# Altium footprint library Cyberdeck.PcbLib: 261 footprints (part 7 of 17)
Each footprint in its own frame and in the unit in brackets; x right, y up, seen from the top. Pads: shape width x height; smd on the part's side, far side on the other; paste and mask are expansions set on the pad; w line width, h text height; cw(c..) or ccw(c..) is an arc to the next point about the centre after c.
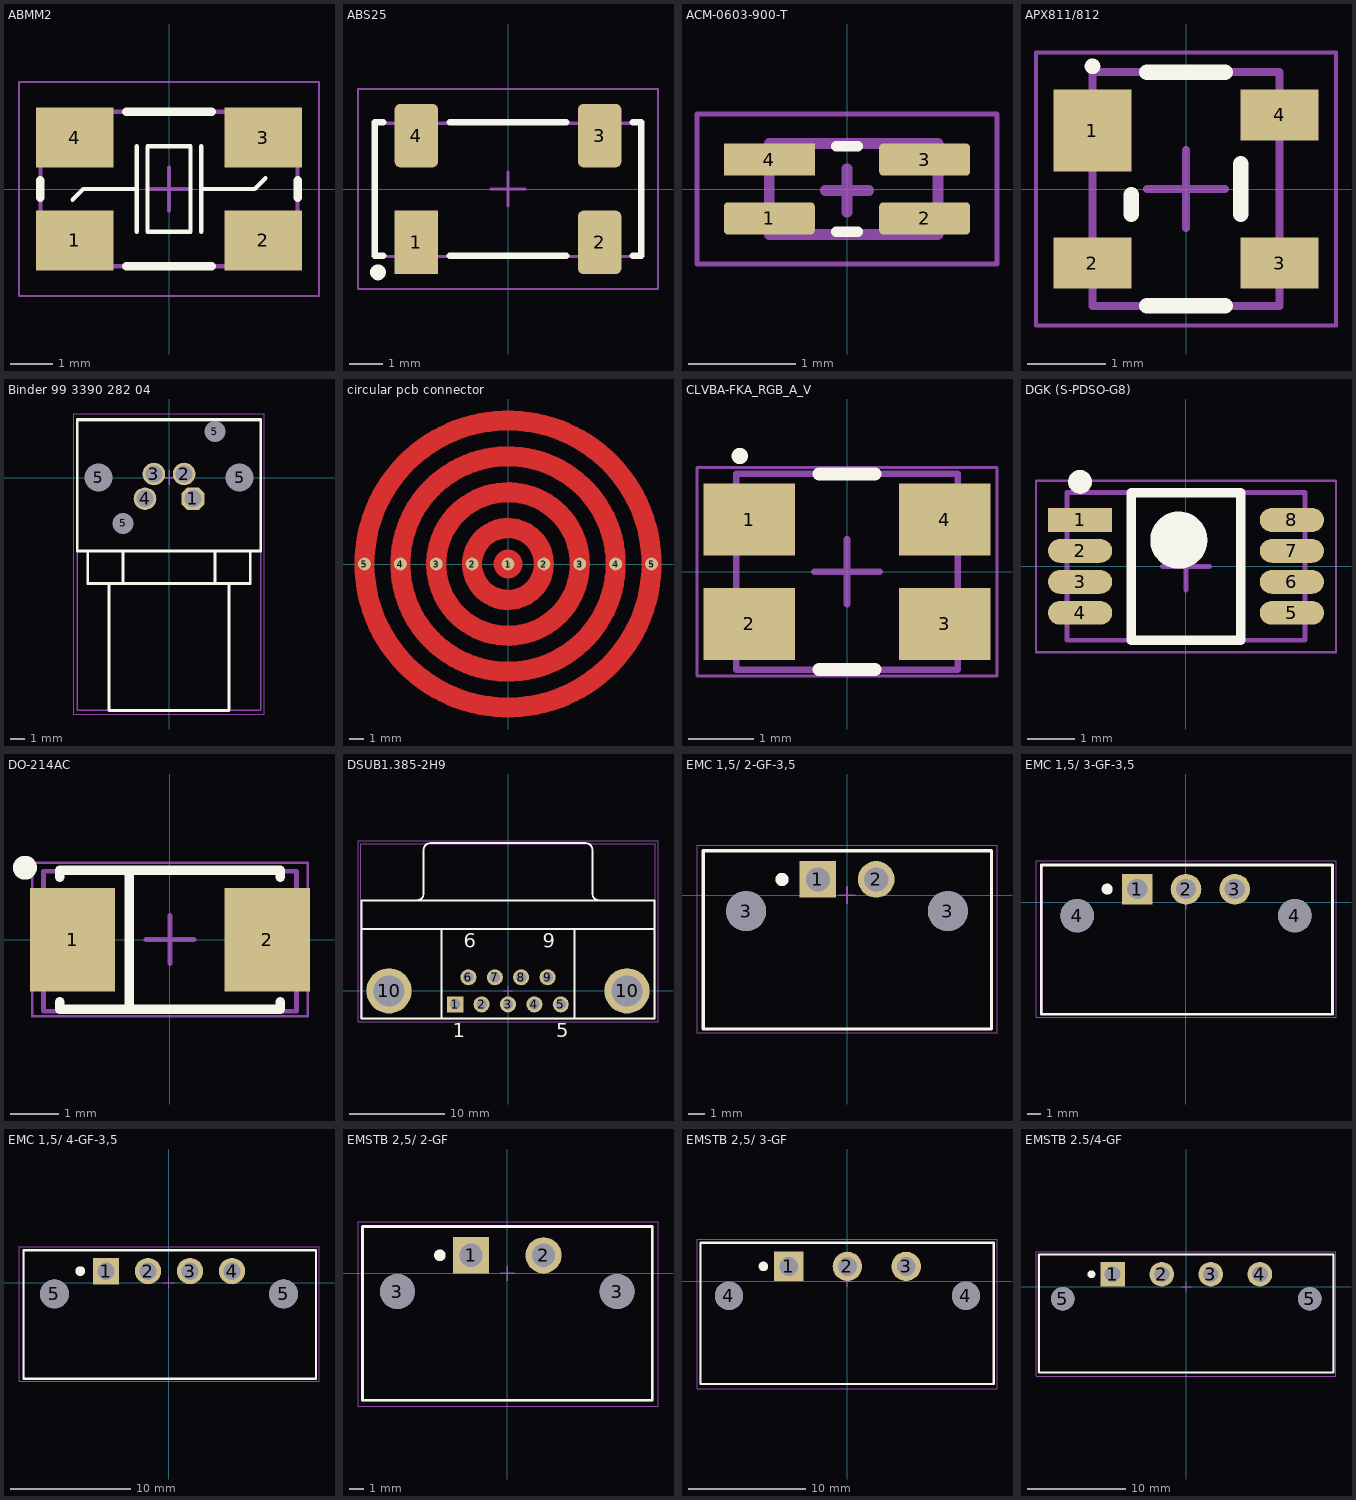
[diagram p6: the footprints below, top view; thin cyan lines are the x and y axes]

## ABMM2 [mm] "ABMM2"
height 1.2
pads (4):
  rect 1.8x1.4 smd: 1(-2.2,-1.2) 2(2.2,-1.2) 3(2.2,1.2) 4(-2.2,1.2)
Top Overlay:
  lines w0.1: -2.25,-0.25 -2,0 -0.75,0 ; -0.75,-1 -0.75,1 ; 0.75,-1 0.75,1 ; 0.75,0 2,0 2.25,0.25 ; -0.5,-1 0.5,-1 0.5,1 -0.5,1 -0.5,0.5 -0.5,-0.5 -0.5,-1
  lines w0.2: -3,-0.2 -3,0.2 ; -1,-1.8 1,-1.8 ; -1,1.8 1,1.8 ; 3,-0.2 3,0.2
Assembly Top:
  lines w0.1: -3,-1.8 -3,1.8 3,1.8 3,-1.8 -3,-1.8 ; -3,-1.8 -3,-1.8
Courtyard Top:
  lines w0.05: -3.5,-2.5 -3.5,2.5 3.5,2.5 3.5,-2.5 -3.5,-2.5
  lines w0.1: -0.5,0 0.5,0 ; 0,-0.5 0,0.5
3D body "ABMM2.STEP": height 1.21, standoff 0.01, extent -3,-1.8 3,1.8

## ABS25 [mm] "ABS25"
height 2.5
pads (4):
  rect 1.3x1.9 smd: 1(-2.75,-1.6)
  rrect25% 1.3x1.9 smd: 2(2.75,-1.6) 3(2.75,1.6) 4(-2.75,1.6)
Top Overlay:
  circle w0.254: c-3.9,-2.5 r0.112
  lines w0.2: -3.75,-2 -4,-2 -4,2 -3.75,2 ; -1.75,-2 1.75,-2 ; -1.75,2 1.75,2 ; 3.75,-2 4,-2 4,2 3.75,2
Assembly Top:
  lines w0.1: -4.025,-2.025 3.975,-2.025 3.975,1.975 -4.025,1.975 -4.025,-2.025
Courtyard Top:
  lines w0.05: -4.5,-3 4.5,-3 4.5,3 -4.5,3 -4.5,-3
  lines w0.1: -0.5,0 0.5,0 ; 0,-0.5 0,0.5
3D body "ABS25.STEP": height 2.51, standoff -0.15, extent -4.025,-2.025 3.975,1.975

## ACM-0603-900-T [mm] "ACM-0603-900-T"
height 1.1
pads (4):
  rrect25% 0.85x0.3 smd: 1(-0.725,-0.275) 2(0.725,-0.275) 3(0.725,0.275)
  rect 0.85x0.3 smd: 4(-0.725,0.275)
Top Overlay:
  lines w0.1: -0.1,-0.4 0.1,-0.4 ; -0.1,0.4 0.1,0.4
Assembly Top:
  lines w0.1: -0.725,-0.425 0.85,-0.425 0.85,0.425 -0.725,0.425 -0.725,-0.425
Courtyard Top:
  lines w0.05: -1.4,-0.7 1.4,-0.7 1.4,0.7 -1.4,0.7 -1.4,-0.7
  lines w0.1: -0.203,-0.015 0.203,-0.015 ; 0,-0.218 0,0.188
3D body "ACM-0603.STEP": height 1.11, standoff -0.02, extent -0.738,-0.425 0.862,0.425

## APX811/812 [mm] "SOT143, 4-Leads, Body 2.90x2.37mm, Pitch 1.90mm, IPC Medium Density"
height 1
pads (4):
  rect 1x1.05 smd: 1(-1.2,0.75)
  rect 1x0.65 smd: 2(-1.2,-0.95) 3(1.2,-0.95) 4(1.2,0.95)
Top Overlay:
  circle w0.1: c-1.2,1.575 r0.05
  lines w0.2: -0.7,-0.325 -0.7,-0.075 ; -0.5,-1.5 0.5,-1.5 ; -0.5,1.5 0.5,1.5 ; 0.7,-0.325 0.7,0.325
Assembly Top:
  lines w0.1: -1.2,-1.5 -1.2,1.5 1.2,1.5 1.2,-1.5 -1.2,-1.5
Courtyard Top:
  lines w0.05: -1.925,-1.75 -1.925,1.75 1.925,1.75 1.925,-1.75 -1.925,-1.75
  lines w0.1: -0.5,0 0.5,0 ; 0,-0.5 0,0.5
3D body "User Library-SOT143-1.STEP": height 1.22, standoff 0, extent -1.182,-1.45 1.181,1.45

## Binder 99 3390 282 04 [mm] "Binder 99 3390 282 04"
height 12
pads (8):
  oct 1.6x1.6 hole 1.2: 1(1.7,-1.5)
  round 1.6 hole 1.2: 2(1.07,0.25) 3(-1.07,0.25) 4(-1.7,-1.5)
  round 1.5 hole 2 unplated: 5(-5,0) 5(5,0)
  round 1 hole 1.5 unplated: 5(-3.25,-3.25) 5(3.25,3.25)
Top Overlay:
  lines w0.2: -5.75,-5.2 -5.75,-7.5 5.75,-7.5 5.75,-5.2 ; -4.25,-7.5 -4.25,-16.5 4.25,-16.5 4.25,-7.5 ; -3.25,-7.5 -3.25,-5.25 ; 3.25,-7.5 3.25,-5.25 ; -6.5,-5.2 -6.5,4.1 6.5,4.1 6.5,-5.2 -6.5,-5.2
Assembly Top:
  lines w0.1: -6.499,-16.5 6.5,-16.5 6.5,4 -6.499,4 -6.499,-16.5
Courtyard Top:
  lines w0.05: -6.75,-16.75 -6.75,4.5 6.75,4.5 6.75,-16.75 -6.75,-16.75
  lines w0.1: -0.5,0 0.5,0 ; 0,-0.5 0,0.5
3D body "99_3390_282_04.stp": height 12.01, standoff -4.49, extent -6.499,-16.5 6.5,4

## circular pcb connector [mm]
pads (9):
  round 0.9 hole 0.3: 1(0,0) 2(-2.5,0) 2(2.5,0) 3(-5,0) 3(5,0) 4(-7.5,0) 4(7.5,0) 5(-10,0) 5(10,0)
Top Layer:
  circle w1: c0,0 r0.5
  circle w1.4: c0,0 r2.5
  circle w1.4: c0,0 r5
  circle w1.4: c0,0 r7.5
  circle w1.4: c0,0 r10
Bottom Layer:
  lines w1: -10,0 cw(c0,0) 10,0 ; -7.5,0 cw(c0,0) 7.5,0 ; -5,0 cw(c0,0) 5,0 ; -2.5,0 cw(c0,0) 2.5,0
Top Solder:
  circle w1.7: c0,0 r10
  circle w1.7: c0,0 r7.5
  circle w1.7: c0,0 r5
  circle w1.7: c0,0 r2.5
  circle w1.3: c0,0 r0.5

## CLVBA-FKA_RGB_A_V [mm] "SMD, 4-Leads, Body 3.2x2.8mm"
height 2.1
pads (4):
  rect 1.4x1.1 smd: 1(-1.5,0.8) 2(-1.5,-0.8) 3(1.5,-0.8) 4(1.5,0.8)
Top Overlay:
  circle w0.125: c-1.644,1.775 r0.062
  lines w0.2: -0.429,-1.5 0.429,-1.5 ; -0.429,1.5 0.429,1.5
Assembly Top:
  lines w0.1: -1.7,-1.5 1.7,-1.5 1.7,1.5 -1.7,1.5 -1.7,-1.5
Courtyard Top:
  lines w0.05: -2.3,-1.6 2.3,-1.6 2.3,1.6 -2.3,1.6 -2.3,-1.6
  lines w0.1: -0.5,0 0.5,0 ; 0,-0.5 0,0.5
3D body: height 2, standoff 1.6, extent -1,-1 1,-0.4
3D body: height 2, standoff 1.6, extent -1,-0.4 1,0.4
3D body: height 1.6, standoff 0.9, extent -1.7,-1.5 1.7,1.5
3D body: height 2.1, standoff 1.6, extent 0,-1.5 1.7,1.5
3D body: height 2.1, standoff 1.6, extent -1.7,-1.5 0,1.5
3D body: height 2, standoff 1.6, extent -1,0.4 1,1
3D body: height 1.1, standoff 0, extent -1.85,-1.1 1.85,-0.4
3D body: height 1.1, standoff 0, extent -1.85,0.4 1.85,1.1
3D body: height 0.9, standoff 0, extent -1.7,-1.5 1.7,1.5

## DGK (S-PDSO-G8) [mm] "TSOP, 8-Leads, Body 3.00x3.00mm, Pitch 0.65mm, IPC Medium Density"
height 1.1
pads (8):
  rect 1.35x0.5 smd: 1(-2.225,0.975)
  oval 1.35x0.5 smd: 2(-2.225,0.325) 3(-2.225,-0.325) 4(-2.225,-0.975) 5(2.225,-0.975) 6(2.225,-0.325) 7(2.225,0.325) 8(2.225,0.975)
Top Overlay:
  circle w0.6: c-0.15,0.55 r0.3
  circle w0.25: c-2.225,1.775 r0.125
  lines w0.2: -1.15,-1.55 1.15,-1.55 1.15,1.55 -1.15,1.55 -1.15,-1.55
Assembly Top:
  lines w0.1: -2.5,-1.55 2.5,-1.55 2.5,1.55 -2.5,1.55 -2.5,-1.55
Courtyard Top:
  lines w0.05: -3.15,-1.8 3.15,-1.8 3.15,1.8 -3.15,1.8 -3.15,-1.8
  lines w0.1: -0.5,0 0.5,0 ; 0,-0.5 0,0.5
3D body "DGK (S-PDSO-G8).step": height 1.1, standoff 0, extent -2.45,-1.55 2.45,1.55

## DO-214AC [mil] "DO-214AC"
height 96.06
pads (2):
  rect 70x85 smd: 1(-80,0) 2(80,0)
Top Overlay:
  circle w9.84: c-119.09,59.06 r4.92
  lines w7.87: -90.55,-51.18 -90.55,-57.09 90.55,-57.09 90.55,-51.18 ; -90.55,51.18 -90.55,57.09 90.55,57.09 90.55,51.18 ; -33.46,-56.1 -33.46,57.09
Assembly Top:
  lines w3.94: -103.95,-58.86 103.94,-58.86 103.94,56.1 -103.95,56.1 -103.95,-58.86
Courtyard Top:
  lines w1.97: -113.19,-62.99 113.19,-62.99 113.19,62.99 -113.19,62.99 -113.19,-62.99
  lines w3.94: -19.69,0 19.68,0 ; 0,-19.68 0,19.68
3D body "Diode SMA.stp": height 94.95, standoff 0, extent -103.94,-58.86 103.93,56.1

## DSUB1.385-2H9 [mm] "Connector; D Subminiature; 9 Position; Right Angle; Pitch 1.385 mm"
height 12.75
pads (11):
  rect 1.69x1.69 hole 1.09: 1(-5.54,-1.42)
  round 1.69 hole 1.09: 2(-2.77,-1.42) 3(0,-1.42) 4(2.77,-1.42) 5(5.54,-1.42) 6(-4.155,1.42) 7(-1.385,1.42) 8(1.385,1.42) 9(4.155,1.42)
  round 4.76 hole 3.26: 10(-12.495,0) 10(12.495,0)
Top Overlay:
  lines w0.2: -15.4,6.5 15.4,6.5 ; -9.56,9.505 ccw(c-9.56,10.2) -8.865,10.2 -8.865,14.8 ; -8.86,14.805 cw(c-8.165,14.805) -8.165,15.5 8.165,15.5 cw(c8.165,14.805) 8.86,14.805 ; -7,-2.9 -7,6.5 ; 7,-2.9 7,6.5 ; 8.865,14.8 8.865,10.2 ccw(c9.56,10.2) 9.56,9.505 ; -15.4,-2.9 15.4,-2.9 15.4,9.5 -15.4,9.5 -15.4,-2.9
  text "6" at -4.655,4.525 h1.5
  text "9" at 3.655,4.525 h1.5
  text "5" at 5.04,-4.875 h1.5
  text "1" at -5.79,-4.875 h1.5
Assembly Top:
  lines w0.1: -15.45,-2.95 -15.45,15.45 15.45,15.45 15.45,-2.95 ; -15.45,-2.95 -15.45,-2.95 ; -15.45,-2.95 15.45,-2.95 ; 15.45,-2.95 15.45,-2.95
Courtyard Top:
  lines w0.05: -15.75,-3.25 -15.75,15.75 15.75,15.75 15.75,-3.25 -15.75,-3.25
  lines w0.1: -0.5,0 0.5,0 ; 0,-0.5 0,0.5
3D body "DB9.STEP": height 12.51, standoff -3.99, extent -15.45,-2.95 15.45,15.45

## EMC 1,5/ 2-GF-3,5 [mm] "EMC 1,5/ 2-GF-3,5"
height 7
pads (4):
  rect 2.2x2.2 hole 1.45: 1(-1.75,0.95)
  round 2.2 hole 1.45: 2(1.75,0.95)
  round 2.4 hole 2.4 unplated: 3(-6.05,-0.95) 3(6.05,-0.95)
Top Overlay:
  circle w0.5: c-3.9,0.95 r0.15
  lines w0.2: -8.625,-8.025 -8.625,2.675 8.675,2.675 8.675,-8.025 -8.625,-8.025
Assembly Top:
  lines w0.1: -8.625,-8.025 8.675,-8.025 8.675,2.675 -8.625,2.675 -8.625,-8.025
Courtyard Top:
  lines w0.05: -9,-8.25 9,-8.25 9,3 -9,3 -9,-8.25
  lines w0.1: -0.5,0 0.5,0 ; 0,-0.5 0,0.5
3D body "1897241_05.stp": height 7.01, standoff -3.49, extent -8.625,-8.025 8.675,2.675

## EMC 1,5/ 3-GF-3,5 [mm] "EMC 1,5/ 3-GF-3,5"
height 7
pads (5):
  rect 2.2x2.2 hole 1.45: 1(-3.5,0.95)
  round 2.2 hole 1.45: 2(0,0.95) 3(3.5,0.95)
  round 2.4 hole 2.4 unplated: 4(-7.8,-0.95) 4(7.8,-0.95)
Top Overlay:
  circle w0.5: c-5.65,0.95 r0.15
  lines w0.2: -10.375,-8.025 10.5,-8.025 10.5,2.675 -10.375,2.675 -10.375,-8.025
Assembly Top:
  lines w0.1: -10.3,-8 -10.3,2.7 10.5,2.7 10.5,-8 -10.3,-8
Courtyard Top:
  lines w0.05: -10.75,-8.25 -10.75,3 10.75,3 10.75,-8.25 -10.75,-8.25
  lines w0.1: -0.5,0 0.5,0 ; 0,-0.5 0,0.5
3D body "1897254_05.stp": height 7.01, standoff -3.49, extent -10.3,-8 10.5,2.7

## EMC 1,5/ 4-GF-3,5 [mm] "EMC 1,5/ 4-GF-3,5"
height 7
pads (6):
  rect 2.2x2.2 hole 1.45: 1(-5.25,0.95)
  round 2.2 hole 1.45: 2(-1.75,0.95) 3(1.75,0.95) 4(5.25,0.95)
  round 2.4 hole 2.4 unplated: 5(-9.55,-0.95) 5(9.55,-0.95)
Top Overlay:
  circle w0.5: c-7.4,0.95 r0.15
  lines w0.2: -12.125,-8.025 12.25,-8.025 12.25,2.675 -12.125,2.675 -12.125,-8.025
Assembly Top:
  lines w0.1: -12.05,-8 12.25,-8 12.25,2.7 -12.05,2.7 -12.05,-8
Courtyard Top:
  lines w0.05: -12.5,-8.25 -12.5,3 12.5,3 12.5,-8.25 -12.5,-8.25
  lines w0.1: -0.5,0 0.5,0 ; 0,-0.5 0,0.5
3D body "1897267_05.stp": height 7.01, standoff -3.49, extent -12.05,-8 12.25,2.7

## EMSTB 2,5/ 2-GF [mm] "EMSTB 2,5/ 2-GF"
height 8.6
pads (4):
  rect 2.5x2.5 hole 1.6: 1(-2.5,1.25)
  round 2.5 hole 1.6: 2(2.5,1.25)
  round 2.4 hole 2.4 unplated: 3(-7.58,-1.25) 3(7.58,-1.25)
Top Overlay:
  circle w0.5: c-4.65,1.25 r0.15
  lines w0.2: -10,-8.75 -10,3.25 10,3.25 10,-8.75 -10,-8.75
Assembly Top:
  lines w0.1: -9.975,3.225 10.025,3.225 10.025,-8.775 -9.975,-8.775 -9.975,3.225 ; -9.975,3.225 -9.975,3.225
Courtyard Top:
  lines w0.05: -10.3,-9.15 -10.3,3.55 10.4,3.55 10.4,-9.15 -10.3,-9.15
  lines w0.1: -0.5,0 0.5,0 ; 0,-0.5 0,0.5
3D body "1900073_01.stp": height 8.61, standoff -4.19, extent -9.975,-8.775 10.025,3.225

## EMSTB 2,5/ 3-GF [mm] "EMSTB 2,5/ 3-GF"
height 8.6
pads (5):
  rect 2.5x2.5 hole 1.6: 1(-5,1.25)
  round 2.5 hole 1.6: 2(0,1.25) 3(5,1.25)
  round 2.4 hole 2.4 unplated: 4(-10.08,-1.25) 4(10.08,-1.25)
Top Overlay:
  circle w0.5: c-7.15,1.25 r0.15
  lines w0.2: -12.5,-8.75 12.45,-8.75 12.45,3.25 -12.5,3.25 -12.5,-8.75
Assembly Top:
  lines w0.1: -12.525,3.225 -12.525,-8.775 ; -12.5,3.225 12.475,3.225 12.475,-8.775 -12.525,-8.775 ; -12.525,-8.775 -12.525,-8.775
Courtyard Top:
  lines w0.05: -12.8,-9.15 12.725,-9.15 12.725,3.55 -12.8,3.55 -12.8,-9.15
  lines w0.1: -0.5,0 0.5,0 ; 0,-0.5 0,0.5
3D body "1900086_02.stp": height 8.61, standoff -4.19, extent -12.525,-8.775 12.475,3.225

## EMSTB 2.5/4-GF [mm] "EMSTB 2.5/4-GF"
height 8.6
pads (6):
  rect 2.5x2.5 hole 1.6: 1(-7.5,1.25)
  round 2.5 hole 1.6: 2(-2.5,1.25) 3(2.5,1.25) 4(7.5,1.25)
  round 2.4 hole 2.4 unplated: 5(-12.58,-1.25) 5(12.58,-1.25)
Top Overlay:
  circle w0.5: c-9.65,1.25 r0.15
  lines w0.2: -15,-8.75 -15,3.25 15,3.25 15,-8.75 -15,-8.75
Assembly Top:
  lines w0.1: 14.95,3.275 14.95,-8.725 -15.05,-8.725 -15.05,3.275 14.95,3.275 ; 14.95,3.275 14.95,3.275
Courtyard Top:
  lines w0.05: -15.3,-9.15 -15.3,3.55 15.25,3.55 15.25,-9.15 -15.3,-9.15
  lines w0.1: -0.5,0 0.5,0 ; 0,-0.5 0,0.5
3D body "1900099_01.stp": height 8.61, standoff -4.19, extent -15.05,-8.725 14.95,3.275